# Altium footprint library myLibraryAltium.PcbLib: 215 footprints (part 14 of 14)
Each footprint in its own frame and in the unit in brackets; x right, y up, seen from the top. Pads: shape width x height; smd on the part's side, far side on the other; paste and mask are expansions set on the pad; w line width, h text height; cw(c..) or ccw(c..) is an arc to the next point about the centre after c.
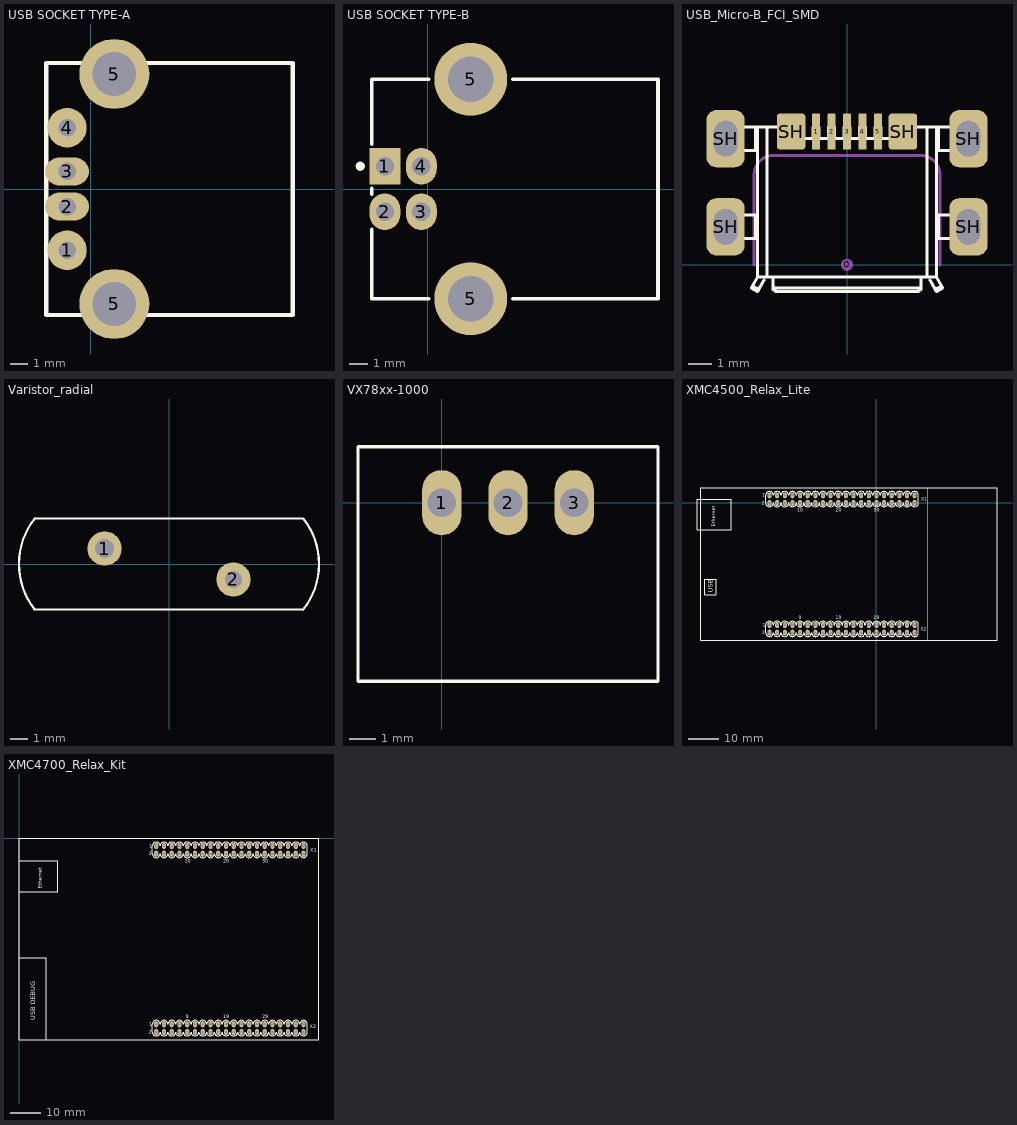
[diagram p13: the footprints below, top view; thin cyan lines are the x and y axes]

## USB SOCKET TYPE-A [mm]
pads (6):
  round 2.25 hole 1: 1(-1.35,-3.5) 4(-1.35,3.5)
  oval 2.5x1.6 hole 1: 2(-1.35,-1) 3(-1.35,1)
  round 4 hole 2.5: 5(1.35,-6.57) 5(1.35,6.57)
Top Overlay:
  lines w0.254: -2.55,-7.2 11.55,-7.2 11.55,7.2 -2.55,7.2 -2.55,-7.2

## USB SOCKET TYPE-B [mm]
pads (6):
  rect 1.7x2 hole 1: 1(-2.355,1.25)
  oval 1.7x2 hole 1: 2(-2.355,-1.25) 3(-0.355,-1.25) 4(-0.355,1.25)
  round 4 hole 2.5: 5(2.355,-6.02) 5(2.355,6.02)
Top Overlay:
  circle w0.25: c-3.705,1.25 r0.125
  lines w0.2: -3.075,-2.21 -3.075,-6.02 0.055,-6.02 ; -3.075,-0.29 -3.075,0.05 ; -3.075,2.45 -3.075,6.02 0.055,6.02 ; 4.655,-6.02 12.635,-6.02 12.635,6.02 4.655,6.02

## USB_Micro-B_FCI_SMD [mm]
height 2.286
pads (12):
  round 0.508 on Mech15: 0(0,0)
  rrect20% 0.35x1.5 smd: 1(-1.3,5.6) 2(-0.65,5.6) 3(0,5.6) 4(0.65,5.6) 5(1.3,5.6)
  rrect50% 1.6x2.4 hole 1 slot 1.5 at 90 deg: SH(-5.1,1.6) SH(-5.1,5.3) SH(5.1,1.6) SH(5.1,5.3)
  rrect20% 1.2x1.5 smd: SH(-2.35,5.6) SH(2.35,5.6)
Top Overlay:
  lines w0.127: -4.85,1.1 -4.85,2.1 ; -4.85,4.8 -4.85,5.8 ; -3.97,-0.881 -3.71,-1.031 ; -3.85,1.1 -3.85,2.1 ; -3.85,4.8 -3.85,5.8 ; -3.75,1.1 -5.25,1.1 -5.25,2.1 -3.75,2.1 ; -3.75,4.8 -5.25,4.8 -5.25,5.8 -2.577,5.8 ; -3.75,5.8 -3.75,-0.5 ; -3.49,-0.651 -3.76,-1.118 -4.02,-0.968 -3.75,-0.5 ; -3.35,-0.5 -3.35,5.8 ; -3.1,-1.031 -3.1,-0.5 ; -2.526,5.793 -2.526,5.8 ; -2.443,5.748 -2.007,5.352 ; -2.024,5.8 -1.825,5.8 -1.825,5.3 ; -1.873,5.3 1.873,5.3 ; -1.425,5.3 -1.425,5.8 -1.175,5.8 -1.175,5.3 ; -0.775,5.3 -0.775,5.8 -0.525,5.8 -0.525,5.3 ; -0.125,5.3 -0.125,5.8 0.125,5.8 0.125,5.3 ; 0.525,5.3 0.525,5.8 0.775,5.8 0.775,5.3 ; 1.175,5.3 1.175,5.8 1.425,5.8 1.425,5.3 ; 1.825,5.3 1.825,5.8 2.024,5.8 ; 2.007,5.352 2.443,5.748 ; 2.526,5.793 2.526,5.8 ; 2.577,5.8 5.25,5.8 5.25,4.8 3.75,4.8 ; 3.1,-1.031 3.1,-0.5 ; 3.35,-0.5 3.35,5.8 ; 3.49,-0.651 3.76,-1.118 4.02,-0.968 3.75,-0.5 ; 3.71,-1.031 3.97,-0.881 ; 3.75,1.1 5.25,1.1 5.25,2.1 3.75,2.1 ; 3.75,5.8 3.75,-0.5 ; 3.85,1.1 3.85,2.1 ; 3.85,4.8 3.85,5.8 ; 4.85,1.1 4.85,2.1 ; 4.85,4.8 4.85,5.8 ; -3.75,-0.5 -3.1,-0.5 ; -3.1,-0.5 3.1,-0.501 ; 3.1,-0.5 3.75,-0.5 ; -3,-1.118 3,-1.118 3,-0.968 -3,-0.968 -3,-1.118
Top Solder:
  region: 1.905,4.826 1.905,6.35 -1.905,6.35 -1.905,4.826
Mechanical 13:
  lines w0.127: -3.49,-0.651 ccw(c-3.75,-0.501) -3.45,-0.5 ; -3.1,-1.031 ccw(c-3.006,-1.024) -3,-1.118 ; -3.1,-0.881 ccw(c-3.006,-0.874) -3,-0.968 ; -2.577,5.8 cw(c-2.577,5.6) -2.443,5.748 ; -2.229,5.553 ccw(c-2.275,5.8) -2.024,5.8 ; -2.007,5.352 ccw(c-1.873,5.5) -1.873,5.3 ; 1.873,5.3 ccw(c1.873,5.5) 2.007,5.352 ; 2.024,5.8 ccw(c2.275,5.8) 2.229,5.553 ; 2.443,5.748 cw(c2.577,5.6) 2.577,5.8 ; 3,-1.118 ccw(c3.006,-1.024) 3.1,-1.031 ; 3,-0.968 ccw(c3.006,-0.874) 3.1,-0.881 ; 3.45,-0.5 ccw(c3.75,-0.501) 3.49,-0.651
Mechanical 15:
  lines w0.127: -3.9,0 -3.9,3.797 cw(c-3.1,3.797) -3.1,4.597 3.1,4.597 cw(c3.1,3.797) 3.9,3.797 3.9,0

## Varistor_radial [mm]
pads (2):
  round 2 hole 1.1: 1(-3.75,0.9)
  round 2 hole 1: 2(3.75,-0.9)
Top Overlay:
  lines w0.127: -7.849,-2.65 7.823,-2.65 ; -7.822,-2.646 cw(c-4.42,0) -7.807,2.665 ; -7.798,2.65 7.823,2.65 ; 7.807,-2.665 ccw(c4.42,0) 7.822,2.646
3D body "User Library-S14K25 MOV.step": height 18.5, standoff -3, extent -7.75,-1.965 7.75,2.235

## VX78xx-1000 [mm]
pads (3):
  oval 1.5x2.5 hole 1.1: 1(0,0) 2(2.54,0) 3(5.08,0)
Top Overlay:
  lines w0.127: -3.21,-6.85 2.875,-6.85 8.29,-6.85 8.29,2.15 -3.21,2.15 -3.21,-6.85
3D body "CUI_VX7815-1000.step": height 18, standoff -3.6, extent -3.134,-6.68 8.366,2.32

## XMC4500_Relax_Lite [mm]
pads (80):
  oval 1.356x2 hole 0.9: X1.1(-35.56,2.54) X1.2(-35.56,0) X1.3(-33.02,2.54) X1.4(-33.02,0) X1.5(-30.48,2.54) X1.6(-30.48,0) X1.7(-27.94,2.54) X1.8(-27.94,0) X1.9(-25.4,2.54) X1.10(-25.4,0) X1.11(-22.86,2.54) X1.12(-22.86,0) X1.13(-20.32,2.54) X1.14(-20.32,0) X1.15(-17.78,2.54) X1.16(-17.78,0) X1.17(-15.24,2.54) X1.18(-15.24,0) X1.19(-12.7,2.54) X1.20(-12.7,0) X1.21(-10.16,2.54) X1.22(-10.16,0) X1.23(-7.62,2.54) X1.24(-7.62,0) X1.25(-5.08,2.54) X1.26(-5.08,0) X1.27(-2.54,2.54) X1.28(-2.54,0) X1.29(0,2.54) X1.30(0,0) X1.31(2.54,2.54) X1.32(2.54,0) X1.33(5.08,2.54) X1.34(5.08,0) X1.35(7.62,2.54) X1.36(7.62,0) X1.37(10.16,2.54) X1.38(10.16,0) X1.39(12.7,2.54) X1.40(12.7,0) X2.1(-35.56,-40.64) X2.2(-35.56,-43.18) X2.3(-33.02,-40.64) X2.4(-33.02,-43.18) X2.5(-30.48,-40.64) X2.6(-30.48,-43.18) X2.7(-27.94,-40.64) X2.8(-27.94,-43.18) X2.9(-25.4,-40.64) X2.10(-25.4,-43.18) X2.11(-22.86,-40.64) X2.12(-22.86,-43.18) X2.13(-20.32,-40.64) X2.15(-17.78,-40.64) X2.16(-17.78,-43.18) X2.17(-15.24,-40.64) X2.18(-15.24,-43.18) X2.19(-12.7,-40.64) X2.20(-12.7,-43.18) X2.21(-10.16,-40.64) X2.22(-10.16,-43.18) X2.23(-7.62,-40.64) X2.24(-7.62,-43.18) X2.25(-5.08,-40.64) X2.26(-5.08,-43.18) X2.27(-2.54,-40.64) X2.28(-2.54,-43.18) X2.29(0,-40.64) X2.30(0,-43.18) X2.31(2.54,-40.64) X2.32(2.54,-43.18) X2.33(5.08,-40.64) X2.34(5.08,-43.18) X2.35(7.62,-40.64) X2.36(7.62,-43.18) X2.37(10.16,-40.64) X2.38(10.16,-43.18) X2.39(12.7,-40.64) X2.40(12.7,-43.18)
  oval 1.356x2 hole 0.813: X2.14(-20.32,-43.18)
Top Overlay:
  pour cut-out: 17.08,-45.72 17.08,5.08
  lines w0.127: -59.69,-8.89 -59.69,1.27 -48.26,1.27 -48.26,-8.89 -59.69,-8.89 ; -58.42,-45.72 17.08,-45.72 40.1,-45.72 40.1,5.08 17.08,5.08 -58.42,5.08 -58.42,-45.72 ; -57.15,-30.48 -57.15,-25.4 -53.34,-25.4 -53.34,-30.48 -57.15,-30.48 ; -36.83,-43.18 ccw(c-35.56,-43.18) -34.29,-43.18 ccw(c-33.02,-43.18) -31.75,-43.18 ccw(c-30.48,-43.18) -29.21,-43.18 ccw(c-27.94,-43.18) -26.67,-43.18 ccw(c-25.4,-43.18) -24.13,-43.18 ccw(c-22.86,-43.18) -21.59,-43.18 ccw(c-20.32,-43.18) -19.05,-43.18 ccw(c-17.78,-43.18) -16.51,-43.18 ccw(c-15.24,-43.18) -13.97,-43.18 ccw(c-12.7,-43.18) -11.43,-43.18 ccw(c-10.16,-43.18) -8.89,-43.18 ccw(c-7.62,-43.18) -6.35,-43.18 ccw(c-5.08,-43.18) -3.81,-43.18 ccw(c-2.54,-43.18) -1.27,-43.18 ccw(c0,-43.18) 1.27,-43.18 ccw(c2.54,-43.18) 3.81,-43.18 ccw(c5.08,-43.18) 6.35,-43.18 ccw(c7.62,-43.18) 8.89,-43.18 ccw(c10.16,-43.18) 11.43,-43.18 ccw(c12.7,-43.18) 13.97,-43.18 13.97,-40.64 ccw(c12.7,-40.64) 11.43,-40.64 ccw(c10.16,-40.64) 8.89,-40.64 ccw(c7.62,-40.64) 6.35,-40.64 ccw(c5.08,-40.64) 3.81,-40.64 ccw(c2.54,-40.64) 1.27,-40.64 ccw(c0,-40.64) -1.27,-40.64 ccw(c-2.54,-40.64) -3.81,-40.64 ccw(c-5.08,-40.64) -6.35,-40.64 ccw(c-7.62,-40.64) -8.89,-40.64 ccw(c-10.16,-40.64) -11.43,-40.64 ccw(c-12.7,-40.64) -13.97,-40.64 ccw(c-15.24,-40.64) -16.51,-40.64 ccw(c-17.78,-40.64) -19.05,-40.64 ccw(c-20.32,-40.64) -21.59,-40.64 ccw(c-22.86,-40.64) -24.13,-40.64 ccw(c-25.4,-40.64) -26.67,-40.64 ccw(c-27.94,-40.64) -29.21,-40.64 ccw(c-30.48,-40.64) -31.75,-40.64 ccw(c-33.02,-40.64) -34.29,-40.64 ccw(c-35.56,-40.64) -36.83,-40.64 -36.83,-43.18 ; -36.83,0 ccw(c-35.56,0) -34.29,0 ccw(c-33.02,0) -31.75,0 ccw(c-30.48,0) -29.21,0 ccw(c-27.94,0) -26.67,0 ccw(c-25.4,0) -24.13,0 ccw(c-22.86,0) -21.59,0 ccw(c-20.32,0) -19.05,0 ccw(c-17.78,0) -16.51,0 ccw(c-15.24,0) -13.97,0 ccw(c-12.7,0) -11.43,0 ccw(c-10.16,0) -8.89,0 ccw(c-7.62,0) -6.35,0 ccw(c-5.08,0) -3.81,0 ccw(c-2.54,0) -1.27,0 ccw(c0,0) 1.27,0 ccw(c2.54,0) 3.81,0 ccw(c5.08,0) 6.35,0 ccw(c7.62,0) 8.89,0 ccw(c10.16,0) 11.43,0 ccw(c12.7,0) 13.97,0 13.97,2.54 ccw(c12.7,2.54) 11.43,2.54 ccw(c10.16,2.54) 8.89,2.54 ccw(c7.62,2.54) 6.35,2.54 ccw(c5.08,2.54) 3.81,2.54 ccw(c2.54,2.54) 1.27,2.54 ccw(c0,2.54) -1.27,2.54 ccw(c-2.54,2.54) -3.81,2.54 ccw(c-5.08,2.54) -6.35,2.54 ccw(c-7.62,2.54) -8.89,2.54 ccw(c-10.16,2.54) -11.43,2.54 ccw(c-12.7,2.54) -13.97,2.54 ccw(c-15.24,2.54) -16.51,2.54 ccw(c-17.78,2.54) -19.05,2.54 ccw(c-20.32,2.54) -21.59,2.54 ccw(c-22.86,2.54) -24.13,2.54 ccw(c-25.4,2.54) -26.67,2.54 ccw(c-27.94,2.54) -29.21,2.54 ccw(c-30.48,2.54) -31.75,2.54 ccw(c-33.02,2.54) -34.29,2.54 ccw(c-35.56,2.54) -36.83,2.54 -36.83,0
  text "10" at -26.275,-3 h1.14
  text "2" at -38.085,-0.555 h1.14
  text "1" at -37.91,1.985 h1.14
  text "29" at -0.875,-38.64 h1.14
  text "19" at -13.575,-38.64 h1.14
  text "9" at -25.87,-38.64 h1.14
  text "X1" at 14.844,0.715 h1.14
  text "Ethernet" at -53.569,-7.874 h1.14
  text "USB" at -54.508,-29.947 h1.52
  text "X2" at 14.744,-42.51 h1.14
  text "1" at -37.885,-41.14 h1.14
  text "2" at -38.06,-43.68 h1.14
  text "20" at -13.525,-3 h1.14
  text "30" at -0.875,-3 h1.14

## XMC4700_Relax_Kit [mil]
pads (80):
  oval 53.39x78.74 hole 35.43: X1.1(1770,-100) X1.2(1770,-200) X1.3(1870,-100) X1.4(1870,-200) X1.5(1970,-100) X1.6(1970,-200) X1.7(2070,-100) X1.8(2070,-200) X1.9(2170,-100) X1.10(2170,-200) X1.11(2270,-100) X1.12(2270,-200) X1.13(2370,-100) X1.14(2370,-200) X1.15(2470,-100) X1.16(2470,-200) X1.17(2570,-100) X1.18(2570,-200) X1.19(2670,-100) X1.20(2670,-200) X1.21(2770,-100) X1.22(2770,-200) X1.23(2870,-100) X1.24(2870,-200) X1.25(2970,-100) X1.26(2970,-200) X1.27(3070,-100) X1.28(3070,-200) X1.29(3170,-100) X1.30(3170,-200) X1.31(3270,-100) X1.32(3270,-200) X1.33(3370,-100) X1.34(3370,-200) X1.35(3470,-100) X1.36(3470,-200) X1.37(3570,-100) X1.38(3570,-200) X1.39(3670,-100) X1.40(3670,-200) X2.1(1770,-2400) X2.2(1770,-2500) X2.3(1870,-2400) X2.4(1870,-2500) X2.5(1970,-2400) X2.6(1970,-2500) X2.7(2070,-2400) X2.8(2070,-2500) X2.9(2170,-2400) X2.10(2170,-2500) X2.11(2270,-2400) X2.12(2270,-2500) X2.13(2370,-2400) X2.15(2470,-2400) X2.16(2470,-2500) X2.17(2570,-2400) X2.18(2570,-2500) X2.19(2670,-2400) X2.20(2670,-2500) X2.21(2770,-2400) X2.22(2770,-2500) X2.23(2870,-2400) X2.24(2870,-2500) X2.25(2970,-2400) X2.26(2970,-2500) X2.27(3070,-2400) X2.28(3070,-2500) X2.29(3170,-2400) X2.30(3170,-2500) X2.31(3270,-2400) X2.32(3270,-2500) X2.33(3370,-2400) X2.34(3370,-2500) X2.35(3470,-2400) X2.36(3470,-2500) X2.37(3570,-2400) X2.38(3570,-2500) X2.39(3670,-2400) X2.40(3670,-2500)
  oval 53.39x78.74 hole 32: X2.14(2370,-2500)
Top Overlay:
  lines w5: 0,-2600 3870.08,-2600 ; 0,-1540 350,-1540 350,-1855 350,-2285 350,-2600 ; 0,-690 500,-690 500,-290 0,-290 ; 0,0 3870.08,0 ; 1720,-2500 ccw(c1770,-2500) 1820,-2500 ccw(c1870,-2500) 1920,-2500 ccw(c1970,-2500) 2020,-2500 ccw(c2070,-2500) 2120,-2500 ccw(c2170,-2500) 2220,-2500 ccw(c2270,-2500) 2320,-2500 ccw(c2370,-2500) 2420,-2500 ccw(c2470,-2500) 2520,-2500 ccw(c2570,-2500) 2620,-2500 ccw(c2670,-2500) 2720,-2500 ccw(c2770,-2500) 2820,-2500 ccw(c2870,-2500) 2920,-2500 ccw(c2970,-2500) 3020,-2500 ccw(c3070,-2500) 3120,-2500 ccw(c3170,-2500) 3220,-2500 ccw(c3270,-2500) 3320,-2500 ccw(c3370,-2500) 3420,-2500 ccw(c3470,-2500) 3520,-2500 ccw(c3570,-2500) 3620,-2500 ccw(c3670,-2500) 3720,-2500 3720,-2400 ccw(c3670,-2400) 3620,-2400 ccw(c3570,-2400) 3520,-2400 ccw(c3470,-2400) 3420,-2400 ccw(c3370,-2400) 3320,-2400 ccw(c3270,-2400) 3220,-2400 ccw(c3170,-2400) 3120,-2400 ccw(c3070,-2400) 3020,-2400 ccw(c2970,-2400) 2920,-2400 ccw(c2870,-2400) 2820,-2400 ccw(c2770,-2400) 2720,-2400 ccw(c2670,-2400) 2620,-2400 ccw(c2570,-2400) 2520,-2400 ccw(c2470,-2400) 2420,-2400 ccw(c2370,-2400) 2320,-2400 ccw(c2270,-2400) 2220,-2400 ccw(c2170,-2400) 2120,-2400 ccw(c2070,-2400) 2020,-2400 ccw(c1970,-2400) 1920,-2400 ccw(c1870,-2400) 1820,-2400 ccw(c1770,-2400) 1720,-2400 1720,-2500 ; 1720,-200 ccw(c1770,-200) 1820,-200 ccw(c1870,-200) 1920,-200 ccw(c1970,-200) 2020,-200 ccw(c2070,-200) 2120,-200 ccw(c2170,-200) 2220,-200 ccw(c2270,-200) 2320,-200 ccw(c2370,-200) 2420,-200 ccw(c2470,-200) 2520,-200 ccw(c2570,-200) 2620,-200 ccw(c2670,-200) 2720,-200 ccw(c2770,-200) 2820,-200 ccw(c2870,-200) 2920,-200 ccw(c2970,-200) 3020,-200 ccw(c3070,-200) 3120,-200 ccw(c3170,-200) 3220,-200 ccw(c3270,-200) 3320,-200 ccw(c3370,-200) 3420,-200 ccw(c3470,-200) 3520,-200 ccw(c3570,-200) 3620,-200 ccw(c3670,-200) 3720,-200 3720,-100 ccw(c3670,-100) 3620,-100 ccw(c3570,-100) 3520,-100 ccw(c3470,-100) 3420,-100 ccw(c3370,-100) 3320,-100 ccw(c3270,-100) 3220,-100 ccw(c3170,-100) 3120,-100 ccw(c3070,-100) 3020,-100 ccw(c2970,-100) 2920,-100 ccw(c2870,-100) 2820,-100 ccw(c2770,-100) 2720,-100 ccw(c2670,-100) 2620,-100 ccw(c2570,-100) 2520,-100 ccw(c2470,-100) 2420,-100 ccw(c2370,-100) 2320,-100 ccw(c2270,-100) 2220,-100 ccw(c2170,-100) 2120,-100 ccw(c2070,-100) 2020,-100 ccw(c1970,-100) 1920,-100 ccw(c1870,-100) 1820,-100 ccw(c1770,-100) 1720,-100 1720,-200
  lines w8: 0,-2600 0,0 ; 3870.08,-2600 3870.08,0
  text "Ethernet" at 291,-650 h45
  text "USB DEBUG" at 210,-2350 h60
  text "X1" at 3754.39,-171.83 h45
  text "X2" at 3750.46,-2453.61 h45
  text "10" at 2135.55,-318.11 h45
  text "2" at 1670.59,-221.85 h45
  text "1" at 1677.48,-121.85 h45
  text "29" at 3135.55,-2321.26 h45
  text "19" at 2635.55,-2321.26 h45
  text "9" at 2151.5,-2321.26 h45
  text "1" at 1678.46,-2419.68 h45
  text "2" at 1671.57,-2519.68 h45
  text "20" at 2637.52,-318.11 h45
  text "30" at 3135.55,-318.11 h45